# Altium footprint library PcbLib2.PcbLib: 4 footprints
Each footprint in its own frame and in the unit in brackets; x right, y up, seen from the top. Pads: shape width x height; smd on the part's side, far side on the other; paste and mask are expansions set on the pad; w line width, h text height; cw(c..) or ccw(c..) is an arc to the next point about the centre after c.
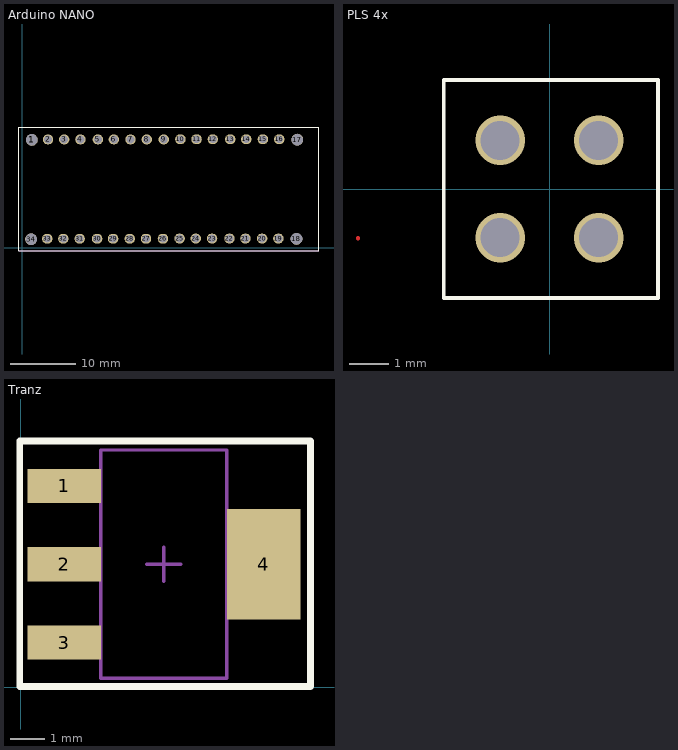
[diagram p0: the footprints below, top view; thin cyan lines are the x and y axes]

## Arduino NANO [mm]
pads (34):
  round 1.8 hole 1.78: 1(1.475,16.525) 17(42.175,16.575) 18(42.05,1.35) 34(1.35,1.3)
  oval 1.6x1.524 hole 1.2: 2(3.95,16.6) 3(6.425,16.6) 4(8.925,16.6) 5(11.6,16.6) 6(14.05,16.6) 7(16.6,16.6) 8(19.1,16.6) 9(21.7,16.6) 10(24.25,16.625) 11(26.725,16.625) 12(29.225,16.625) 13(31.9,16.625) 14(34.35,16.625) 15(36.9,16.625) 16(39.4,16.625) 19(39.275,1.4) 20(36.775,1.4) 21(34.225,1.4) 22(31.775,1.4) 23(29.1,1.4) 24(26.6,1.4) 25(24.125,1.4) 26(21.575,1.375) 27(18.975,1.375) 28(16.475,1.375) 29(13.925,1.375) 30(11.475,1.375) 31(8.8,1.375) 32(6.3,1.375) 33(3.825,1.375)
Top Overlay:
  lines w0.1: 1.35,16.4 cw(c1.475,16.4) 1.475,16.525 ; -0.5,-0.5 -0.5,18.5 45.5,18.5 45.5,-0.5 -0.5,-0.5
Mechanical 15:
  lines w0.1: -0.5,-0.5 -0.5,0 -0.5,18.5 45.5,18.5 45.5,-0.5 -0.5,-0.5
3D body "User Library-arduino_nano.STEP": height 12.6, standoff -6, extent 0.11,0.01 45.11,18.01

## PLS [mm]
3D body "User Library-DS1021.STEP": height 3, standoff -8.6, extent -2.667,-0.889 -0.127,1.651

## PLS 4x [mm]
via -1.275,1.25 diameter 1.27 hole 1
via 1.25,1.25 diameter 1.27 hole 1
via 1.25,-1.25 diameter 1.27 hole 1
via -1.275,-1.25 diameter 1.27 hole 1
Top Layer:
  lines w0.1: -4.925,-1.275 -4.925,-1.25
Top Overlay:
  lines w0.1: -2.725,-2.8 -2.725,-2.6 -2.725,2.8 2.775,2.8 2.775,-2.8 -2.725,-2.8
Bottom Overlay:
  lines w0.1: -2.55,-2.575 2.55,-2.575 2.55,2.575 -2.55,2.575 -2.55,-2.575
3D body "User Library-DS1021.STEP": height 3, standoff -8.6, extent -2.545,0.03 -0.005,2.57
3D body "User Library-DS1021.STEP": height 3, standoff -8.6, extent -2.545,-2.57 -0.005,-0.03
3D body "User Library-DS1021.STEP": height 3, standoff -8.6, extent 0,-2.57 2.54,-0.03
3D body "User Library-DS1021.STEP": height 3, standoff -8.6, extent 0,0.03 2.54,2.57

## Tranz [mm]
pads (4):
  rect 2.15x1 smd: 1(1.278,5.913) 2(1.278,3.613) 3(1.278,1.313)
  rect 2.15x3.25 smd: 4(7.128,3.613)
Top Overlay:
  lines w0.2: -0.025,0.025 8.5,0.025 8.5,7.225 -0.025,7.225 -0.025,4.616 -0.025,0.025
Mechanical 13:
  lines w0.1: 2.353,0.263 6.053,0.263 6.053,6.963 2.353,6.963 2.353,0.263
Mechanical 15:
  lines w0.05: -0.047,0.013 -0.047,7.225 8.453,7.225 8.453,0.013 -0.047,0.013
  lines w0.1: 3.703,3.613 4.703,3.613 ; 4.203,3.113 4.203,4.113
3D body: height 1.8, standoff 0.02, extent 2.353,0.263 6.053,6.963